# Altium footprint library Libreria PCB.PcbLib: 92 footprints (part 2 of 6)
Each footprint in its own frame and in the unit in brackets; x right, y up, seen from the top. Pads: shape width x height; smd on the part's side, far side on the other; paste and mask are expansions set on the pad; w line width, h text height; cw(c..) or ccw(c..) is an arc to the next point about the centre after c.
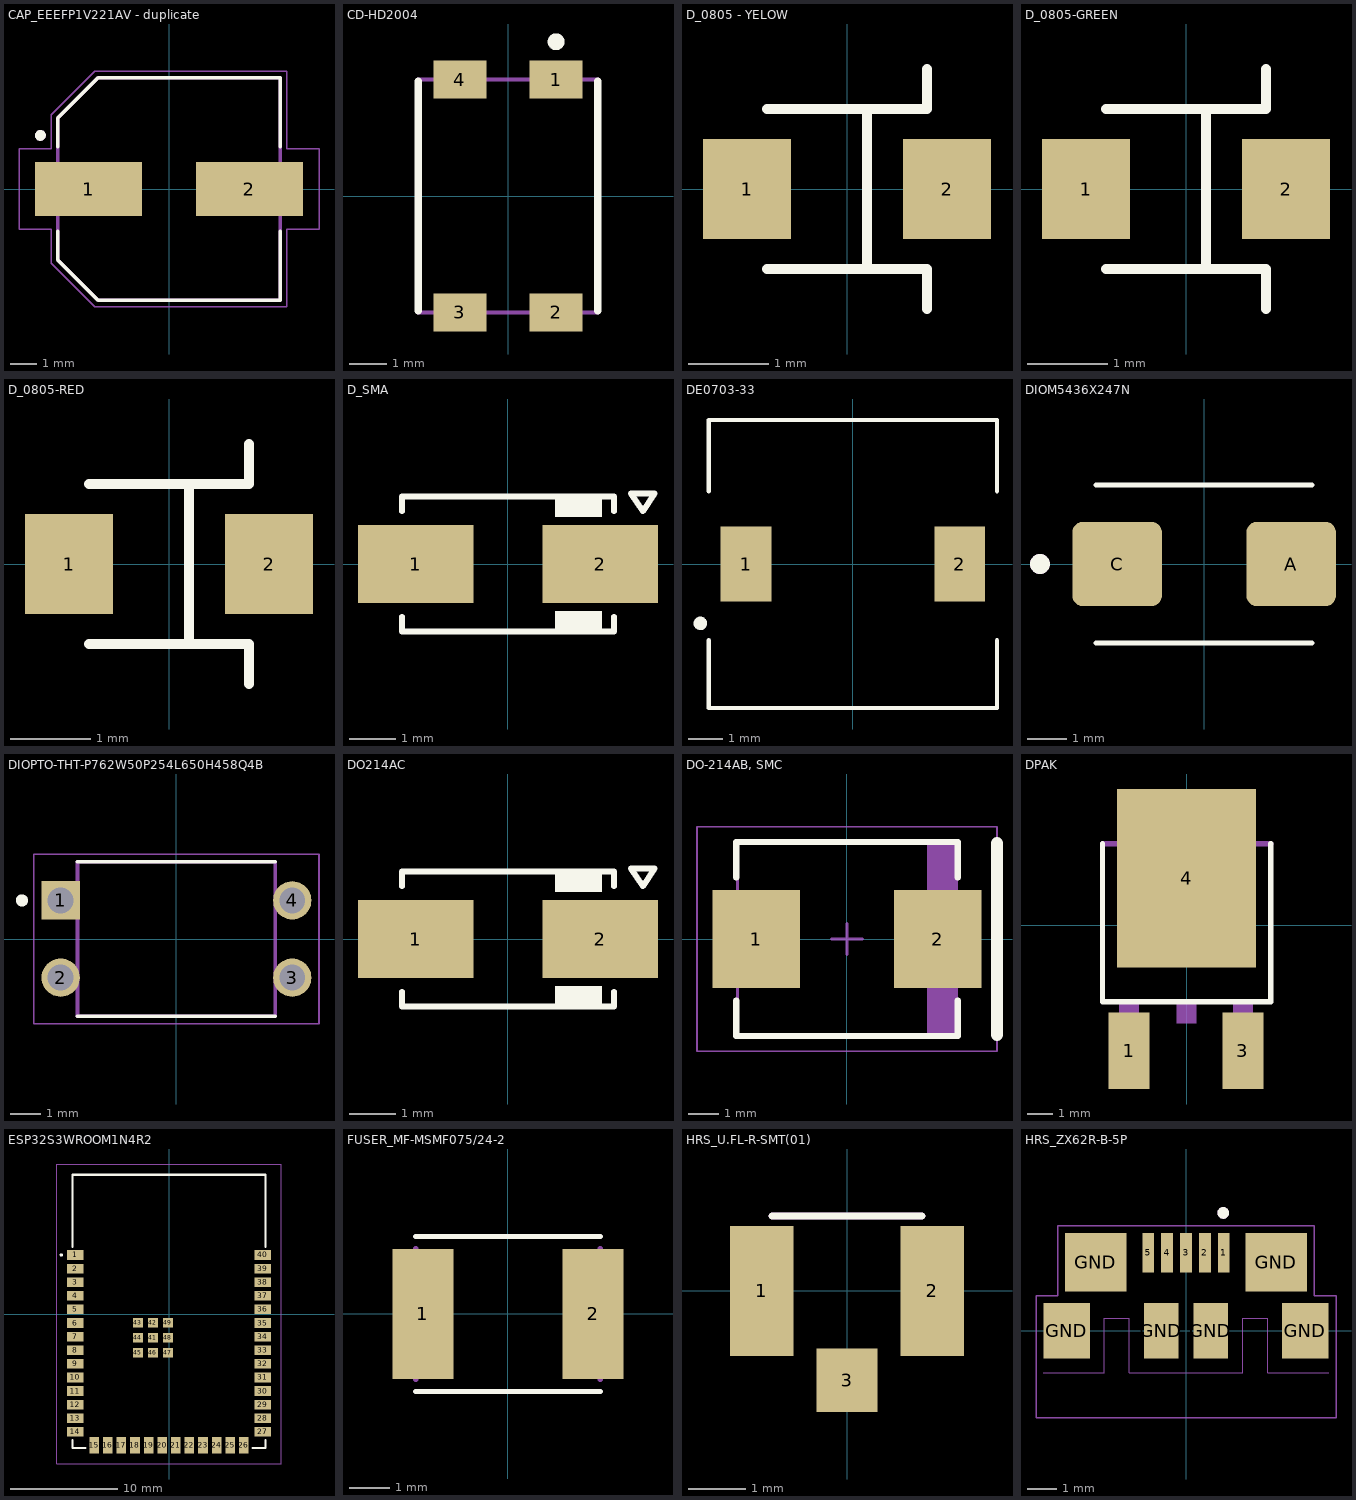
[diagram p1: the footprints below, top view; thin cyan lines are the x and y axes]

## CAP_EEEFP1V221AV - duplicate [mm]
pads (2):
  rect 4x2 smd: 1(-3,0) 2(3,0)
Top Overlay:
  circle w0.2: c-4.8,2 r0.1
  lines w0.127: -4.15,-1.57 -4.15,-2.65 -2.65,-4.15 4.15,-4.15 4.15,-1.57 ; -4.15,1.57 -4.15,2.65 -2.65,4.15 4.15,4.15 4.15,1.57
Mechanical 13:
  circle w0.2: c-4.8,2 r0.1
  lines w0.127: -4.15,-2.65 -2.65,-4.15 4.15,-4.15 4.15,4.15 -2.65,4.15 -4.15,2.65 -4.15,-2.65
Mechanical 15:
  lines w0.05: -5.6,-1.5 -5.6,1.5 -4.4,1.5 -4.4,2.775 -2.775,4.4 4.4,4.4 4.4,1.5 5.6,1.5 5.6,-1.5 4.4,-1.5 4.4,-4.4 -2.775,-4.4 -4.4,-2.775 -4.4,-1.5 -5.6,-1.5
3D body "EEEFP1V221AV-CAP ALUM 220UF 20% 35V SMD.STEP": height 10.5, standoff 0, extent -4.85,-4.15 4.85,4.15

## CD-HD2004 [mm]
pads (4):
  rect 1.4x1 smd: 1(1.27,3.075) 2(1.27,-3.075) 3(-1.27,-3.075) 4(-1.27,3.075)
Top Overlay:
  circle w0.3: c1.27,4.075 r0.071
  lines w0.2: -2.375,-3.025 -2.375,3.025 ; 2.375,-3.025 2.375,3.025
Mechanical 13:
  lines w0.1: -2.375,-3.075 2.375,-3.075 2.375,3.075 -2.375,3.075 -2.375,-3.075
3D body: height 1.07, standoff 0, extent -2.375,-3.075 2.375,3.075

## D_0805 - YELOW [mm] "diodo led 0805"
pads (2):
  rect 1.1x1.25 smd: 1(-1.25,0) 2(1.25,0)
Top Overlay:
  lines w0.127: -1,-1 1,-1 1,-1.5 ; -1,1 1,1 1,1.5 ; 0.25,-1 0.25,1
3D body "led_0805 YEL.STEP": height 1.1, standoff 0, extent -1.01,-0.625 1.01,0.625

## D_0805-GREEN [mm] "diodo GREEN 0805 smd"
pads (2):
  rect 1.1x1.25 smd: 1(-1.25,0) 2(1.25,0)
Top Overlay:
  lines w0.127: -1,-1 1,-1 1,-1.5 ; -1,1 1,1 1,1.5 ; 0.25,-1 0.25,1
3D body "led_0805 GRE.STEP": height 1.1, standoff 0, extent -1.01,-0.625 1.01,0.625

## D_0805-RED [mm] "diodo red 0805 smd"
pads (2):
  rect 1.1x1.25 smd: 1(-1.25,0) 2(1.25,0)
Top Overlay:
  lines w0.127: -1,-1 1,-1 1,-1.5 ; -1,1 1,1 1,1.5 ; 0.25,-1 0.25,1
3D body "RED-CHIPLED-0805.STEP": height 0.9, standoff -0.01, extent -1.05,-0.675 1.05,0.675

## D_SMA [mm]
height 2.4
pads (2):
  rect 2.5x1.7 smd: 1(-2,0) 2(2,0)
Top Overlay:
  rectangle: 1.016,1.016 2.032,1.524
  rectangle: 1.016,-1.524 2.032,-1.016
  lines w0.127: -2.3,-1.143 -2.3,-1.46 2.3,-1.46 2.3,-1.143 ; -2.3,1.143 -2.3,1.46 2.3,1.46 2.3,1.143 ; 2.667,1.524 3.175,1.524 2.921,1.143 2.667,1.524
3D body "User Library-DO-214AC(SMA).STEP": height 2.39, standoff 0.11, extent -2.743,-1.397 2.743,1.397

## DE0703-33 [mm] "Inductor: alambre; SMD; 33uH; 910mA; 240 mO; 7,3x7,3x3,2 mm; ±20%"
pads (2):
  rect 1.5x2.2 smd: 1(-3.15,0) 2(3.15,0)
Top Overlay:
  circle w0.2: c-4.5,-1.75 r0.1
  lines w0.127: -4.25,-2.25 -4.25,-4.25 4.25,-4.25 4.25,-2.25 ; -4.25,2.15 -4.25,4.25 4.25,4.25 4.25,2.15
3D body "User Library-DE0703.STEP": height 3.2, standoff 0, extent -3.65,-3.65 3.65,3.65

## DIOM5436X247N [mm]
pads (2):
  rrect25% 2.25x2.12 smd: A(2.185,0) C(-2.185,0)
Top Overlay:
  circle w0.3: c-4.121,0 r0.1
  lines w0.127: -2.71,-1.98 2.71,-1.98 ; -2.71,1.98 2.71,1.98
Mechanical 13:
  circle w0.3: c-4.121,0 r0.1
3D body "MBRS360BT3G--3DModel-STEP-1.STEP": height 2.49, standoff 0.02, extent -2.72,-1.78 2.72,1.78

## DIOPTO-THT-P762W50P254L650H458Q4B [mm] "optoacoplador"
pads (4):
  rect 1.26x1.26 hole 0.85: 1(-3.81,1.27)
  round 1.26 hole 0.85: 2(-3.81,-1.27) 3(3.81,-1.27) 4(3.81,1.27)
Top Overlay:
  circle w0.2: c-5.08,1.27 r0.1
  lines w0.127: -3.25,-2.54 3.25,-2.54 ; -3.25,2.54 3.25,2.54
Mechanical 13:
  lines w0.127: -3.25,-2.54 -3.25,2.54 3.25,2.54 3.25,-2.54 -3.25,-2.54
Mechanical 15:
  lines w0.05: -4.69,-2.79 4.69,-2.79 4.69,2.79 -4.69,2.79 -4.69,-2.79
3D body "PC817C--3DModel-STEP-56544.STEP": height 4.8, standoff -3.3, extent -3.89,-2.325 3.99,2.255

## DO214AC [mm]
height 2.4
pads (2):
  rect 2.5x1.7 smd: 1(-2,0) 2(2,0)
Top Overlay:
  rectangle: 1.016,-1.524 2.032,-1.016
  rectangle: 1.016,1.016 2.032,1.524
  lines w0.127: -2.3,-1.143 -2.3,-1.46 2.3,-1.46 2.3,-1.143 ; -2.3,1.143 -2.3,1.46 2.3,1.46 2.3,1.143 ; 2.667,1.524 2.921,1.143 3.175,1.524 2.667,1.524
3D body "User Library-DO-214AC(SMA).STEP": height 2.39, standoff 0.11, extent -2.743,-1.397 2.743,1.397

## DO-214AB, SMC [mm] "Diodo Zener"
pads (2):
  rect 2.85x3.2 smd: 1(-2.95,0) 2(2.95,0)
Top Overlay:
  lines w0.2: -3.6,-2 -3.6,-3.15 3.6,-3.15 3.6,-2 ; -3.6,2 -3.6,3.15 3.6,3.15 3.6,2
  lines w0.4: 4.875,-3.11 4.875,3.11
Mechanical 13:
  region: 3.555,3.11 2.599,3.11 2.599,-3.11 3.555,-3.11
  lines w0.1: -3.555,-3.11 3.555,-3.11 3.555,3.11 -3.555,3.11 -3.555,-3.11
Mechanical 15:
  lines w0.05: -4.875,-3.65 4.875,-3.65 4.875,3.65 -4.875,3.65 -4.875,-3.65
  lines w0.1: -0.5,0 0.5,0 ; 0,-0.5 0,0.5
3D body: height 2.63, standoff 2.62, extent 3,-3.11 3.3,3.11
3D body: height 2.62, standoff 0, extent -3.555,-3.11 3.555,3.11

## DPAK [mil]
pads (3):
  rect 63x118 smd: 1(-89,-194) 3(87,-194)
  rect 214.63x275.59 smd: 4(0,72.94)
Top Overlay:
  lines w8: -129.92,125.98 -129.92,-118.11 129.92,-118.11 129.92,125.98
Mechanical 13:
  region: 98.43,155.51 98.43,125.98 -98.43,125.98 -98.43,155.51 -64.96,177.17 64.96,177.17
  region: 15,-151.27 -15.03,-151.27 -15.03,-121 15,-121
  region: 102,-226.17 72.06,-226.17 72.06,-121 102,-121
  region: -74,-226.06 -104.03,-226.06 -104.03,-121 -74,-121
  lines w8: -129.92,125.98 129.92,125.98
  text "4" at -13.02,72.63 h24.04
  text "3" at 78.03,-99.54 h24.01
  text "2" at -8,-99.51 h24
  text "1" at -95.15,-99.65 h24.04
3D body "MJD122.STEP": height 94, standoff -5, extent -127.95,-224.52 127.95,165.48

## ESP32S3WROOM1N4R2 [mm]
pads (49):
  rect 1.5x0.9 smd: 1(-8.75,5.51) 2(-8.75,4.24) 3(-8.75,2.97) 4(-8.75,1.7) 5(-8.75,0.43) 6(-8.75,-0.84) 7(-8.75,-2.11) 8(-8.75,-3.38) 9(-8.75,-4.65) 10(-8.75,-5.92) 11(-8.75,-7.19) 12(-8.75,-8.46) 13(-8.75,-9.73) 14(-8.75,-11) 27(8.75,-11) 28(8.75,-9.73) 29(8.75,-8.46) 30(8.75,-7.19) 31(8.75,-5.92) 32(8.75,-4.65) 33(8.75,-3.38) 34(8.75,-2.11) 35(8.75,-0.84) 36(8.75,0.43) 37(8.75,1.7) 38(8.75,2.97) 39(8.75,4.24) 40(8.75,5.51)
  rect 0.9x1.5 smd: 15(-6.985,-12.25) 16(-5.715,-12.25) 17(-4.445,-12.25) 18(-3.175,-12.25) 19(-1.905,-12.25) 20(-0.635,-12.25) 21(0.635,-12.25) 22(1.905,-12.25) 23(3.175,-12.25) 24(4.445,-12.25) 25(5.715,-12.25) 26(6.985,-12.25)
  rect 0.9x0.9 smd: 41(-1.5,-2.21) 42(-1.5,-0.81) 43(-2.9,-0.81) 44(-2.9,-2.21) 45(-2.9,-3.61) 46(-1.5,-3.61) 47(-0.1,-3.61) 48(-0.1,-2.21) 49(-0.1,-0.81)
Top Overlay:
  lines w0.2: -9,-11.75 -9,-12.5 -7.8,-12.5 ; -9,6.25 -9,13 9,13 9,6.25 ; 7.8,-12.5 9,-12.5 9,-11.75 ; -10.1,5.51 ccw(c-10.05,5.51) -10,5.51 ; -10.1,5.51 cw(c-10.05,5.51) -10,5.51 ; -10.1,5.51 ccw(c-10.05,5.51) -10,5.51
Mechanical 15:
  lines w0.1: -9,13 9,13
Mechanical 20:
  lines w0.1: -10.5,-14 10.5,-14 10.5,14 -10.5,14 -10.5,-14
3D body "ESP32S3WROOM1N4R8--3DModel-STEP-269445.STEP": height 3.25, standoff 0, extent -9,-12.5 9,13

## FUSER_MF-MSMF075/24-2 [mm]
pads (2):
  rect 1.5x3.2 smd: 1(-2.1,0) 2(2.1,0)
Top Overlay:
  lines w0.127: -2.275,-1.913 2.275,-1.913 ; -2.275,1.913 2.275,1.913
Mechanical 13:
  lines w0.127: -2.275,-1.62 -2.275,1.62 ; 2.275,-1.62 2.275,1.62
3D body "step_temp.STEP": height 0.85, standoff 0, extent -2.275,-1.62 2.275,1.62

## HRS_U.FL-R-SMT(01) [mm]
pads (3):
  rect 1.1x2.25 smd: 1(-1.475,0) 2(1.475,0)
  rect 1.05x1.1 smd: 3(0,-1.55)
Top Overlay:
  lines w0.127: -1.3,1.3 1.3,1.3
Mechanical 13:
  lines w0.127: -1.3,1.3 1.3,1.3
Mechanical 14:
  lines w0.127: 1.34,-0.91 1.34,-0.9
3D body "step_temp.STEP": height 1.25, standoff 0, extent -1.5,-1.55 1.5,1.55

## HRS_ZX62R-B-5P [mm]
pads (11):
  rect 0.4x1.35 smd: 1(1.3,2.675) 2(0.65,2.675) 3(0,2.675) 4(-0.65,2.675) 5(-1.3,2.675)
  rect 1.6x1.9 smd: GND(-4.1,0) GND(4.1,0)
  rect 2.1x2 smd: GND(-3.1,2.35) GND(3.1,2.35)
  rect 1.2x1.9 smd: GND(-0.85,0) GND(0.85,0)
Top Overlay:
  circle w0.2: c1.28,4.04 r0.1
Mechanical 1:
  lines w0: -4.9,-1.45 -2.8,-1.45 -2.8,0.43 -1.95,0.43 -1.95,-1.45 1.95,-1.45 1.95,0.43 2.8,0.43 2.8,-1.45 4.9,-1.45
Mechanical 13:
  circle w0.2: c1.28,4.04 r0.1
Mechanical 15:
  lines w0.05: -5.15,-3 5.15,-3 5.15,1.2 4.4,1.2 4.4,3.6 -4.4,3.6 -4.4,1.2 -5.15,1.2 -5.15,-3
3D body "ZX62R-B-5P--3DModel-STEP-1.STEP": height 2.71, standoff -0.23, extent -4.4,-2.75 4.4,2.981